# Altium footprint library IC.PCBLIB: 359 footprints (part 21 of 23)
Each footprint in its own frame and in the unit in brackets; x right, y up, seen from the top. Pads: shape width x height; smd on the part's side, far side on the other; paste and mask are expansions set on the pad; w line width, h text height; cw(c..) or ccw(c..) is an arc to the next point about the centre after c.
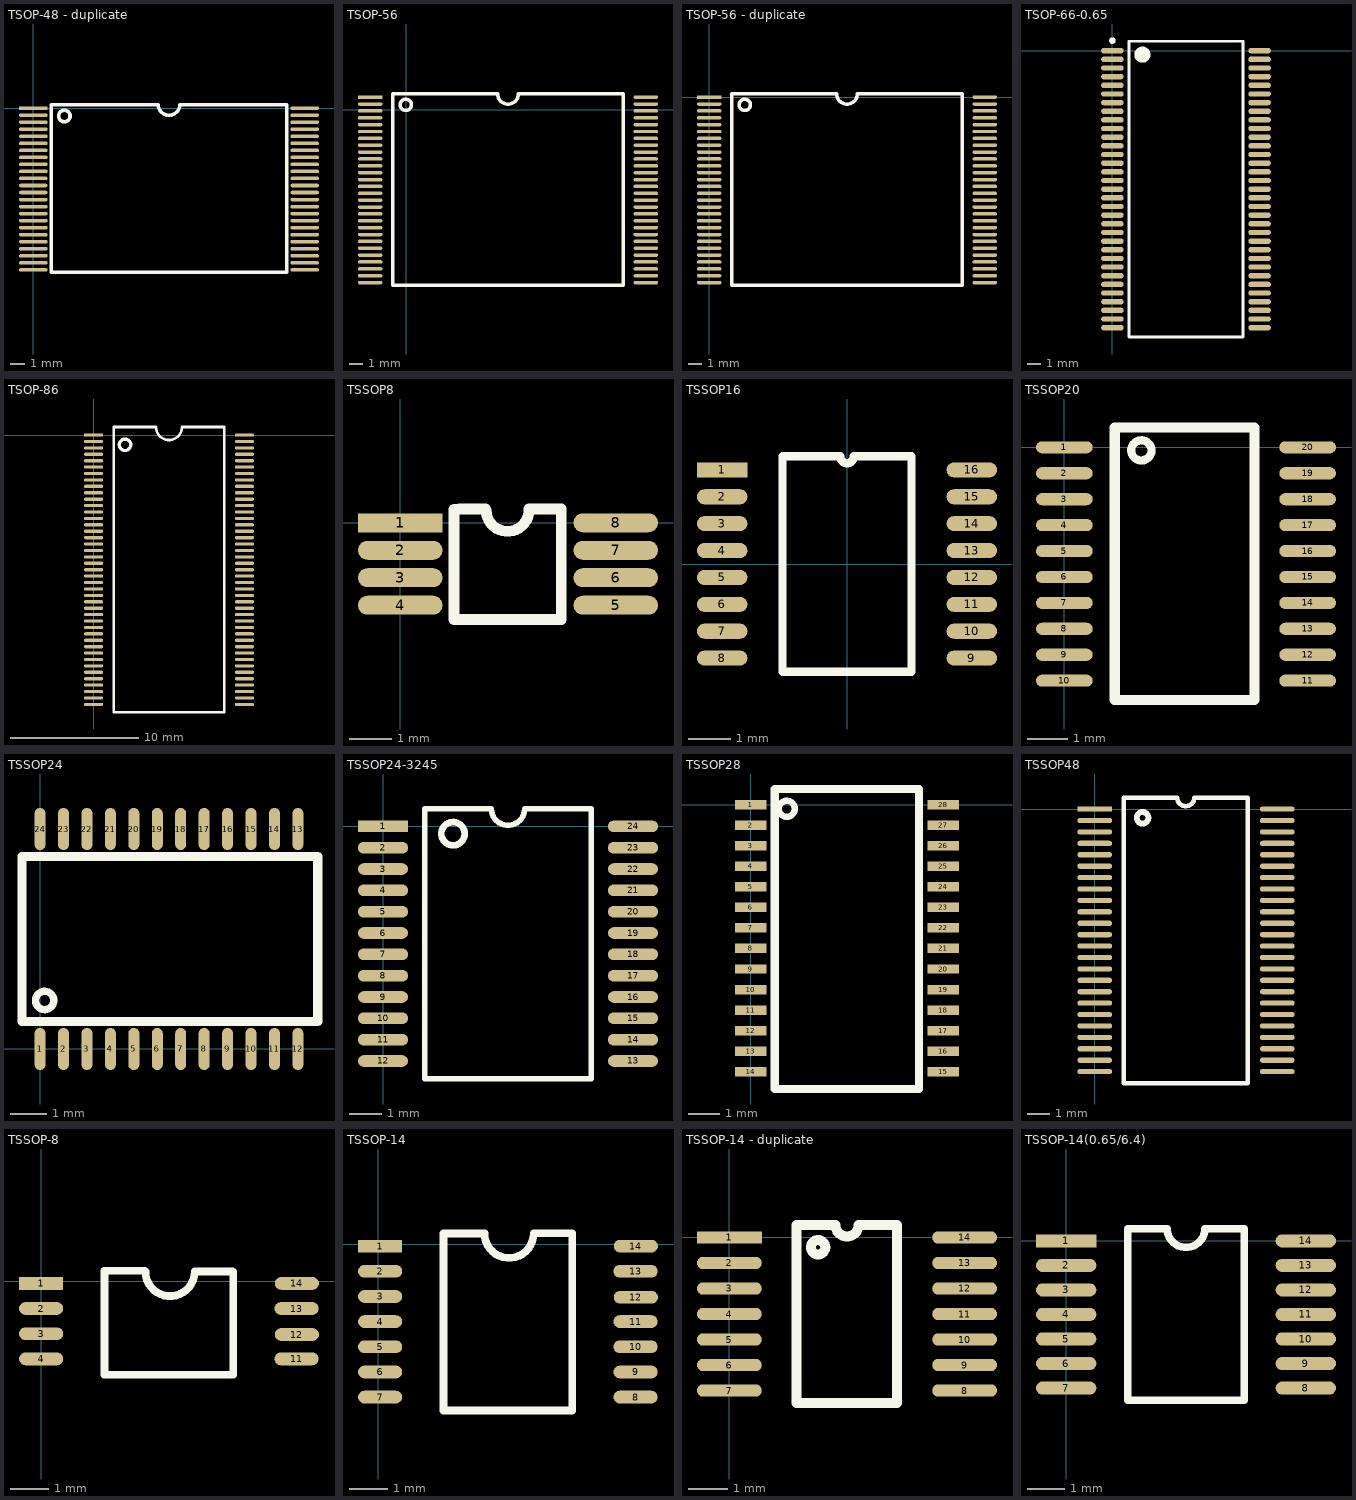
[diagram p20: the footprints below, top view; thin cyan lines are the x and y axes]

## TSOP-48 - duplicate [mil]
pads (48):
  rect 80x10 smd: 1(0,0)
  oval 80x10 smd: 2(0,-19.68) 3(0,-39.37) 4(0,-59.05) 5(0,-78.74) 6(0,-98.42) 7(0,-118.11) 8(0,-137.79) 9(0,-157.48) 10(0,-177.16) 11(0,-196.85) 12(0,-216.53) 13(0,-236.22) 14(0,-255.91) 15(0,-275.59) 16(0,-295.27) 17(0,-314.96) 18(0,-334.64) 19(0,-354.33) 20(0,-374.01) 21(0,-393.7) 22(0,-413.38) 23(0,-433.07) 24(0,-452.75) 25(760,-452.75) 26(760,-433.07) 27(760,-413.38) 28(760,-393.7) 29(760,-374.01) 30(760,-354.33) 31(760,-334.64) 32(760,-314.96) 33(760,-295.27) 34(760,-275.59) 35(760,-255.91) 36(760,-236.22) 37(760,-216.53) 38(760,-196.85) 39(760,-177.16) 40(760,-157.48) 41(760,-137.79) 42(760,-118.11) 43(760,-98.42) 44(760,-78.74) 45(760,-59.05) 46(760,-39.37) 47(760,-19.68) 48(760,0)
TopOverlay:
  circle w10: c86.88,-22 r16.12
  lines w10: 50,-460 710,-460 710,10 409.99,10 cw(c379.99,10) 349.99,10 50,10 50,-460

## TSOP-56 [mil]
pads (56):
  rect 70x10 smd: 1(-104,36)
  oval 70x10 smd: 2(-104,16.32) 3(-104,-3.37) 4(-104,-23.05) 5(-104,-42.74) 6(-104,-62.42) 7(-104,-82.11) 8(-104,-101.8) 9(-104,-121.48) 10(-104,-141.16) 11(-104,-160.85) 12(-104,-180.53) 13(-104,-200.22) 14(-104,-219.91) 15(-104,-239.59) 16(-104,-259.27) 17(-104,-278.96) 18(-104,-298.64) 19(-104,-318.33) 20(-104,-338.01) 21(-104,-357.7) 22(-104,-377.38) 23(-104,-397.07) 24(-104,-416.75) 25(-104,-436.44) 26(-104,-456.12) 27(-104,-475.81) 28(-104,-495.49) 29(686,-495.49) 30(686,-475.81) 31(686,-456.12) 32(686,-436.44) 33(686,-416.76) 34(686,-397.07) 35(686,-377.38) 36(686,-357.7) 37(686,-338.01) 38(686,-318.33) 39(686,-298.64) 40(686,-278.96) 41(686,-259.27) 42(686,-239.59) 43(686,-219.91) 44(686,-200.22) 45(686,-180.53) 46(686,-160.85) 47(686,-141.16) 48(686,-121.48) 49(686,-101.79) 50(686,-82.11) 51(686,-62.42) 52(686,-42.74) 53(686,-23.06) 54(686,-3.37) 55(686,16.32) 56(686,36)
TopOverlay:
  circle w10: c-2.12,14 r16.12
  lines w10: -39,-502.74 -39,46 260.99,46 ccw(c290.99,46) 320.99,46 621,46 621,-502.74 -39,-502.74

## TSOP-56 - duplicate [mil]
pads (56):
  rect 70x10 smd: 1(0,0)
  oval 70x10 smd: 2(0,-19.68) 3(0,-39.37) 4(0,-59.05) 5(0,-78.74) 6(0,-98.42) 7(0,-118.11) 8(0,-137.79) 9(0,-157.48) 10(0,-177.16) 11(0,-196.85) 12(0,-216.53) 13(0,-236.22) 14(0,-255.91) 15(0,-275.59) 16(0,-295.27) 17(0,-314.96) 18(0,-334.64) 19(0,-354.33) 20(0,-374.01) 21(0,-393.7) 22(0,-413.38) 23(0,-433.07) 24(0,-452.75) 25(0,-472.44) 26(0,-492.12) 27(0,-511.81) 28(0,-531.49) 29(790,-531.49) 30(790,-511.81) 31(790,-492.12) 32(790,-472.44) 33(790,-452.76) 34(790,-433.07) 35(790,-413.38) 36(790,-393.7) 37(790,-374.01) 38(790,-354.33) 39(790,-334.64) 40(790,-314.96) 41(790,-295.27) 42(790,-275.59) 43(790,-255.91) 44(790,-236.22) 45(790,-216.53) 46(790,-196.85) 47(790,-177.16) 48(790,-157.48) 49(790,-137.79) 50(790,-118.11) 51(790,-98.42) 52(790,-78.74) 53(790,-59.06) 54(790,-39.37) 55(790,-19.68) 56(790,0)
TopOverlay:
  circle w10: c101.88,-22 r16.12
  lines w10: 65,-538.74 725,-538.74 725,10 424.99,10 cw(c394.99,10) 364.99,10 65,10 65,-538.74

## TSOP-66-0.65 [mm] "TSOP, 66-Leads, Body 22.2x10.2mm (max), Pitch 0.65mm, IPC Medium Density"
height 1.2
pads (66):
  oval 1.7x0.4 smd: 1(0,0) 2(0,-0.65) 3(0,-1.3) 4(0,-1.95) 5(0,-2.6) 6(0,-3.25) 7(0,-3.9) 8(0,-4.55) 9(0,-5.2) 10(0,-5.85) 11(0,-6.5) 12(0,-7.15) 13(0,-7.8) 14(0,-8.45) 15(0,-9.1) 16(0,-9.75) 17(0,-10.4) 18(0,-11.05) 19(0,-11.7) 20(0,-12.35) 21(0,-13) 22(0,-13.65) 23(0,-14.3) 24(0,-14.95) 25(0,-15.6) 26(0,-16.25) 27(0,-16.9) 28(0,-17.55) 29(0,-18.2) 30(0,-18.85) 31(0,-19.5) 32(0,-20.15) 33(0,-20.8) 34(11.05,-20.8) 35(11.05,-20.15) 36(11.05,-19.5) 37(11.05,-18.85) 38(11.05,-18.2) 39(11.05,-17.55) 40(11.05,-16.9) 41(11.05,-16.25) 42(11.05,-15.6) 43(11.05,-14.95) 44(11.05,-14.3) 45(11.05,-13.65) 46(11.05,-13) 47(11.05,-12.35) 48(11.05,-11.7) 49(11.05,-11.05) 50(11.05,-10.4) 51(11.05,-9.75) 52(11.05,-9.1) 53(11.05,-8.45) 54(11.05,-7.8) 55(11.05,-7.15) 56(11.05,-6.5) 57(11.05,-5.85) 58(11.05,-5.2) 59(11.05,-4.55) 60(11.05,-3.9) 61(11.05,-3.25) 62(11.05,-2.6) 63(11.05,-1.95) 64(11.05,-1.3) 65(11.05,-0.65) 66(11.05,0)
TopOverlay:
  circle w0.25: c0,0.75 r0.125
  circle w0.6: c2.25,-0.3 r0.3
  lines w0.2: 1.25,-21.5 1.25,0.7 9.8,0.7 9.8,-21.5 1.25,-21.5

## TSOP-86 [mm]
height 1.27
pads (86):
  rect 1.5x0.25 smd: 1(0,0)
  oval 1.5x0.25 smd: 2(0,-0.5) 3(0,-1) 4(0,-1.5) 5(0,-2) 6(0,-2.5) 7(0,-3) 8(0,-3.5) 9(0,-4) 10(0,-4.5) 11(0,-5) 12(0,-5.5) 13(0,-6) 14(0,-6.5) 15(0,-7) 16(0,-7.5) 17(0,-8) 18(0,-8.5) 19(0,-9) 20(0,-9.5) 21(0,-10) 22(0,-10.5) 23(0,-11) 24(0,-11.5) 25(0,-12) 26(0,-12.5) 27(0,-13) 28(0,-13.5) 29(0,-14) 30(0,-14.5) 31(0,-15) 32(0,-15.5) 33(0,-16) 34(0,-16.5) 35(0,-17) 36(0,-17.5) 37(0,-18) 38(0,-18.5) 39(0,-19) 40(0,-19.5) 41(0,-20) 42(0,-20.5) 43(0,-21) 44(11.76,-21) 45(11.76,-20.5) 46(11.76,-20) 47(11.76,-19.5) 48(11.76,-19) 49(11.76,-18.5) 50(11.76,-18) 51(11.76,-17.5) 52(11.76,-17) 53(11.76,-16.5) 54(11.76,-16) 55(11.76,-15.5) 56(11.76,-15) 57(11.76,-14.5) 58(11.76,-14) 59(11.76,-13.5) 60(11.76,-13) 61(11.76,-12.5) 62(11.76,-12) 63(11.76,-11.5) 64(11.76,-11) 65(11.76,-10.5) 66(11.76,-10) 67(11.76,-9.5) 68(11.76,-9) 69(11.76,-8.5) 70(11.76,-8) 71(11.76,-7.5) 72(11.76,-7) 73(11.76,-6.5) 74(11.76,-6) 75(11.76,-5.5) 76(11.76,-5) 77(11.76,-4.5) 78(11.76,-4) 79(11.76,-3.5) 80(11.76,-3) 81(11.76,-2.5) 82(11.76,-2) 83(11.76,-1.5) 84(11.76,-1) 85(11.76,-0.5) 86(11.76,0)
TopOverlay:
  circle w0.254: c2.451,-0.762 r0.444
  lines w0.2: 4.841,0.625 1.562,0.625 1.562,-21.625 10.198,-21.625 10.198,0.625 ; 4.864,0.625 ccw(c5.88,0.625) 6.896,0.625 10.175,0.625

## TSSOP8 [mm]
pads (8):
  rect 2x0.45 smd: 1(0,0)
  oval 2x0.45 smd: 2(0,-0.65) 3(0,-1.3) 4(0,-1.95) 5(5.1,-1.95) 6(5.1,-1.3) 7(5.1,-0.65) 8(5.1,0)
TopOverlay:
  lines w0.254: 2.016,0.325 1.408,0.325 1.27,0.314 1.27,-2.286 3.81,-2.286 3.81,0.325 3.048,0.325 ; 2.032,0.305 ccw(c2.54,0.305) 3.048,0.305

## TSSOP16 [mm]
pads (16):
  rect 1.2x0.36 smd: 1(-2.97,2.24)
  oval 1.2x0.36 smd: 2(-2.97,1.6) 3(-2.97,0.96) 4(-2.97,0.32) 5(-2.97,-0.32) 6(-2.97,-0.96) 7(-2.97,-1.6) 8(-2.97,-2.24) 9(2.97,-2.24) 10(2.97,-1.6) 11(2.97,-0.96) 12(2.97,-0.32) 13(2.97,0.32) 14(2.97,0.96) 15(2.97,1.6) 16(2.97,2.24)
TopOverlay:
  lines w0.2: -1.535,-2.56 -1.535,2.56 -0.16,2.56 ccw(c0,2.56) 0.16,2.56 1.535,2.56 1.535,-2.56 -1.535,-2.56

## TSSOP20 [mil]
pads (20):
  oval 56x12 smd: 1(0,0) 2(0,-25.59) 3(0,-51.18) 4(0,-76.77) 5(0,-102.36) 6(0,-127.95) 7(0,-153.54) 8(0,-179.13) 9(0,-204.72) 10(0,-230.31) 11(240.16,-230.31) 12(240.16,-204.72) 13(240.16,-179.13) 14(240.16,-153.54) 15(240.16,-127.95) 16(240.16,-102.36) 17(240.16,-76.77) 18(240.16,-51.18) 19(240.16,-25.59) 20(240.16,0)
TopOverlay:
  circle w8: c76,-3 r10
  lines w10: 49.69,-249.33 49.69,19.68 187.54,19.68 187.54,-249.33 49.69,-249.33

## TSSOP24 [mil]
pads (24):
  oval 12x46 smd: 1(0,0) 2(25.59,0) 3(51.18,0) 4(76.77,0) 5(102.36,0) 6(127.95,0) 7(153.54,0) 8(179.13,0) 9(204.72,0) 10(230.31,0) 11(255.91,0) 12(281.5,0) 13(281.5,240.16) 14(255.91,240.16) 15(230.31,240.16) 16(204.72,240.16) 17(179.13,240.16) 18(153.54,240.16) 19(127.95,240.16) 20(102.36,240.16) 21(76.77,240.16) 22(51.18,240.16) 23(25.59,240.16) 24(0,240.16)
TopOverlay:
  circle w8: c5,53 r10
  lines w10: -19.68,30 -19.68,210 303.15,210 303.15,30 -19.68,30

## TSSOP24-3245 [mil]
pads (24):
  rect 60x14 smd: 1(0,0)
  oval 60x14 smd: 2(0,-25.59) 3(0,-51.18) 4(0,-76.77) 5(0,-102.36) 6(0,-127.95) 7(0,-153.54) 8(0,-179.13) 9(0,-204.72) 10(0,-230.32) 11(0,-255.91) 12(0,-281.5) 13(300,-281.5) 14(300,-255.91) 15(300,-230.32) 16(300,-204.72) 17(300,-179.13) 18(300,-153.54) 19(300,-127.95) 20(300,-102.36) 21(300,-76.77) 22(300,-51.18) 23(300,-25.59) 24(300,0)
TopOverlay:
  circle w8: c84,-8.75 r14
  lines w6.69: 50,21.25 130,21.25 ccw(c150,21.25) 170,21.25 250,21.25
  lines w7: 50,21.25 50,-302.75 250,-302.75 250,21.25

## TSSOP28 [mm]
pads (28):
  rect 1x0.3 smd: 1(0,0) 2(0,-0.65) 3(0,-1.3) 4(0,-1.95) 5(0,-2.6) 6(0,-3.25) 7(0,-3.9) 8(0,-4.55) 9(0,-5.2) 10(0,-5.85) 11(0,-6.5) 12(0,-7.15) 13(0,-7.8) 14(0,-8.45) 15(6.1,-8.45) 16(6.1,-7.8) 17(6.1,-7.15) 18(6.1,-6.5) 19(6.1,-5.85) 20(6.1,-5.2) 21(6.1,-4.55) 22(6.1,-3.9) 23(6.1,-3.25) 24(6.1,-2.6) 25(6.1,-1.95) 26(6.1,-1.3) 27(6.1,-0.65) 28(6.1,0)
TopOverlay:
  circle w0.203: c1.143,-0.127 r0.254
  lines w0.254: 0.762,-9 5.334,-9 5.334,0.5 0.762,0.5 0.762,-9

## TSSOP48 [mil]
pads (48):
  rect 60x9 smd: 1(0,0)
  oval 60x9 smd: 2(0,-19.68) 3(0,-39.37) 4(0,-59.05) 5(0,-78.74) 6(0,-98.42) 7(0,-118.11) 8(0,-137.79) 9(0,-157.48) 10(0,-177.16) 11(0,-196.85) 12(0,-216.53) 13(0,-236.22) 14(0,-255.91) 15(0,-275.59) 16(0,-295.27) 17(0,-314.96) 18(0,-334.64) 19(0,-354.33) 20(0,-374.01) 21(0,-393.7) 22(0,-413.38) 23(0,-433.07) 24(0,-452.75) 25(315,-452.75) 26(315,-433.07) 27(315,-413.38) 28(315,-393.7) 29(315,-374.01) 30(315,-354.33) 31(315,-334.64) 32(315,-314.96) 33(315,-295.27) 34(315,-275.59) 35(315,-255.91) 36(315,-236.22) 37(315,-216.53) 38(315,-196.85) 39(315,-177.16) 40(315,-157.48) 41(315,-137.79) 42(315,-118.11) 43(315,-98.42) 44(315,-78.74) 45(315,-59.05) 46(315,-39.37) 47(315,-19.68) 48(315,0)
TopOverlay:
  circle w10: c82.6,-15 r10
  lines w7.87: 50,-472.6 264.09,-472.6 264.09,19.84 171.9,19.84 cw(c157.05,19.84) 142.19,19.84 50,19.84 50,-472.6

## TSSOP-8 [mil]
pads (8):
  rect 45x12.99 smd: 1(-0.16,-2)
  oval 45x12.99 smd: 2(-0.16,-27.59) 3(-0.16,-53.18) 4(-0.16,-78.77) 11(259.69,-78.77) 12(260,-54) 13(259.69,-27.59) 14(260,-2)
TopOverlay:
  lines w7.87: 105.2,10.79 64.21,10.79 64.21,-94.88 195.31,-94.88 195.31,9.84 ; 106,10 ccw(c131,10) 156,10 194.52,10

## TSSOP-14 [mil]
pads (14):
  rect 45x12.99 smd: 1(1.84,-2)
  oval 45x12.99 smd: 2(1.84,-27.59) 3(1.84,-53.18) 4(1.84,-78.77) 5(1.84,-104.36) 6(1.84,-129.95) 7(1.84,-155.54) 8(261.69,-155.54) 9(261.69,-129.95) 10(261.69,-104.36) 11(261.69,-78.77) 12(262,-54) 13(261.69,-27.59) 14(262,-2)
TopOverlay:
  lines w7.87: 107.64,10.79 66.21,10.79 66.21,-169.29 197.31,-169.29 197.31,10.79 ; 108,11 ccw(c133,11) 158,11 197.11,11

## TSSOP-14 - duplicate [mil]
pads (14):
  rect 65x12.5 smd: 1(0,0)
  oval 65x12.5 smd: 2(0,-25.59) 3(0,-51.18) 4(0,-76.77) 5(0,-102.36) 6(0,-127.95) 7(0,-153.54) 8(236,-153.54) 9(236,-127.95) 10(236,-102.36) 11(236,-76.77) 12(236,-51.18) 13(236,-25.59) 14(236,0)
TopOverlay:
  lines w10: 89,-17 cw(c89,-9.79) 90.02,-16.93 ; 67.5,-166 67.5,12.5 106.46,12.5 ccw(c118,12.5) 129.54,12.5 168,12.5 168,-166 67.5,-166

## TSSOP-14(0.65/6.4) [mm]
pads (14):
  rect 1.6x0.35 smd: 1(0,0)
  oval 1.6x0.35 smd: 2(0,-0.65) 3(0,-1.3) 4(0,-1.95) 5(0,-2.6) 6(0,-3.25) 7(0,-3.9) 8(6.35,-3.9) 9(6.35,-3.25) 10(6.35,-2.6) 11(6.35,-1.95) 12(6.35,-1.3) 13(6.35,-0.65) 14(6.35,0)
TopOverlay:
  lines w0.2: 1.635,-4.225 4.715,-4.225 4.715,0.325 3.675,0.325 cw(c3.175,0.325) 2.675,0.325 1.635,0.325 1.635,-4.225